# Altium integrated library Integrated_Circuts.IntLib: 76 symbols (part 2 of 4)

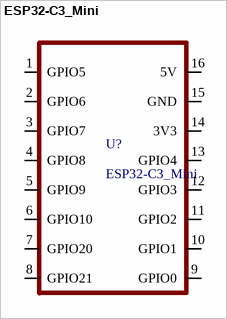
[diagram p23: symbol ESP32-C3_Mini]

## ESP32-C3_Mini
designator U?
footprint ESP32-C3
footprint ESP32-C3_PLS
pins: 1 GPIO5, 2 GPIO6, 3 GPIO7, 4 GPIO8, 5 GPIO9, 6 GPIO10, 7 GPIO20, 8 GPIO21, 9 GPIO0, 10 GPIO1, 11 GPIO2, 12 GPIO3, 13 GPIO4, 14 3V3, 15 GND, 16 5V


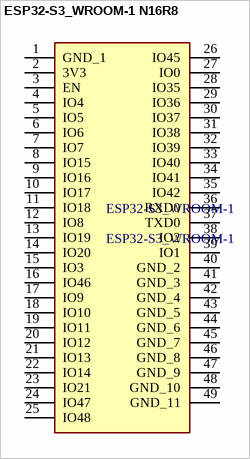
[diagram p24: symbol ESP32-S3_WROOM-1 N16R8]

## ESP32-S3_WROOM-1 N16R8
designator ESP32-S3_WROOM-1, comment ESP32-S3_WROOM-1
ESP32-S3_WROOM-1 N16R8
footprint ESP32S3WROOM1N16R8
pins: 1 GND_1, 2 3V3, 3 EN, 4 IO4, 5 IO5, 6 IO6, 7 IO7, 8 IO15, 9 IO16, 10 IO17, 11 IO18, 12 IO8, 13 IO19, 14 IO20, 15 IO3, 16 IO46, 17 IO9, 18 IO10, 19 IO11, 20 IO12, 21 IO13, 22 IO14, 23 IO21, 24 IO47, 25 IO48, 26 IO45, 27 IO0, 28 IO35, 29 IO36, 30 IO37, 31 IO38, 32 IO39, 33 IO40, 34 IO41, 35 IO42, 36 RXD0, 37 TXD0, 38 IO2, 39 IO1, 40 GND_2, 41 GND_3, 42 GND_4, 43 GND_5, 44 GND_6, 45 GND_7, 46 GND_8, 47 GND_9, 48 GND_10, 49 GND_11


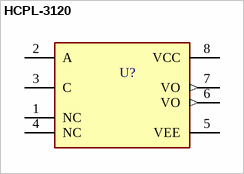
[diagram p25: symbol HCPL-3120]

## HCPL-3120
designator U?  (value not drawn)
footprint HCPL-3120
pins: 1 NC, 2 A, 3 C, 4 NC, 5 VEE (power), 6 VO (out), 7 VO (out), 8 VCC (power)


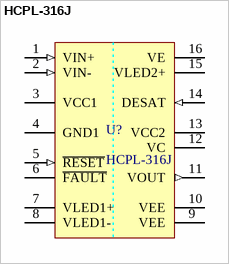
[diagram p26: symbol HCPL-316J]

## HCPL-316J
designator U?
footprint SOIC127P1036X391-16N
pins: 1 VIN+ (in) "Noninverting gate drive voltage output (VOUT) control input.", 2 VIN- (in) "Inverting gate drive voltage output(VOUT) control input.", 3 VCC1 (power) "Positive input supply voltage. (4.5 V to 5.5 V)", 4 GND1 (power) "Input Ground", 5 ~{RESET} (in) "F\A\U\L\T\ reset input.", 6 ~{FAULT} (hiz) "Fault output", 7 VLED1+ "LED 1 anode.", 8 VLED1- "LED 1 cathode.", 9 VEE (power) "Output supply voltage.", 10 VEE (power) "Output supply voltage.", 11 VOUT (out) "Gate drive voltage output.", 12 VC (power) "Collector of output pull-up triple-darlington 0.1 us, asynchronously resets FAULT output high transistor", 13 VCC2 (power) "Positive output supply voltage", 14 DESAT (in) "Desaturation voltage input.", 15 VLED2+ "LED 2 anode.", 16 VE (power) "Common (IGBT emitter) output supply voltage."


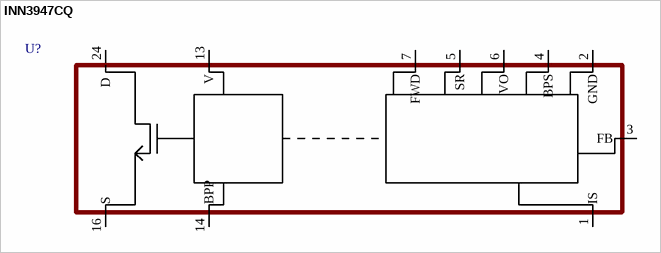
[diagram p27: symbol INN3947CQ]

## INN3947CQ
designator U?
footprint INN3947CQ
pins: 1 IS, 2 GND, 3 FB, 4 BPS, 5 SR, 6 VO, 7 FWD, 13 V, 14 BPP, 16 S, 24 D 


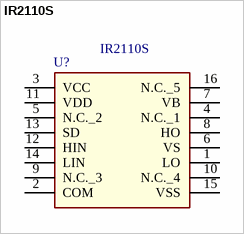
[diagram p28: symbol IR2110S]

## IR2110S
designator U?
IC DRIVER HIGH/LOW SIDE 16-SOIC; Manufacturer_Name: Infineon; Geometry.Height: 2.65mm; Manufacturer_Part_Number: IR2110S; Mouser Part Number: *; Mouser Price/Stock: *; Arrow Part Number: *; Arrow Price/Stock: *; Datasheet Link: https://www.infineon.com/dgdl/ir2110.pdf?fileId=5546d462533600a4015355c80333167e
footprint SOIC127P1036X391-16N
pins: 1 LO, 2 COM, 3 VCC, 4 N.C._1, 5 N.C._2, 6 VS, 7 VB, 8 HO, 9 N.C._3, 10 N.C._4, 11 VDD, 12 HIN, 13 SD, 14 LIN, 15 VSS, 16 N.C._5


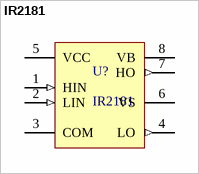
[diagram p29: symbol IR2181]

## IR2181
designator U?
IR2181 Driver
footprint SO8-150
footprint SOIC-8
pins: 1 HIN (in), 2 LIN (in), 3 COM, 4 LO (out), 5 VCC (power), 6 VS (power), 7 HO (out), 8 VB (power)


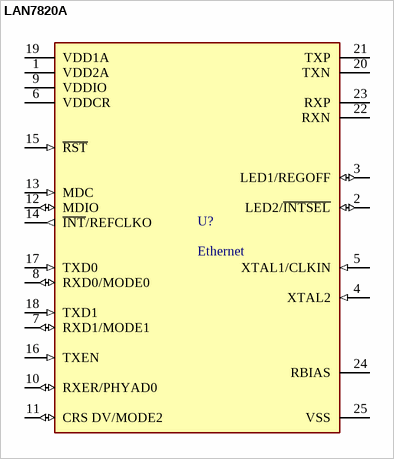
[diagram p30: symbol LAN7820A]

## LAN7820A
designator U?, comment Ethernet
footprint 24QFN-4x4B-IPC_A
footprint 24QFN-4x4B-IPC_B
pins: 1 VDD2A (power), 2 LED2/~{INTSEL} (io), 3 LED1/REGOFF (io), 4 XTAL2 (in), 5 XTAL1/CLKIN (in), 6 VDDCR (power), 7 RXD1/MODE1 (io), 8 RXD0/MODE0 (io), 9 VDDIO (power), 10 RXER/PHYAD0 (io), 11 CRS DV/MODE2 (io), 12 MDIO (io), 13 MDC (in), 14 ~{INT}/REFCLKO (out), 15 ~{RST} (in), 16 TXEN (in), 17 TXD0 (in), 18 TXD1 (in), 19 VDD1A (power), 20 TXN, 21 TXP, 22 RXN, 23 RXP, 24 RBIAS, 25 VSS (power)


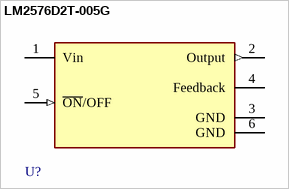
[diagram p31: symbol LM2576D2T-005G]

## LM2576D2T-005G
designator U?  (value not drawn)
footprint ON_Semiconductor_936A-02_MFG
pins: 1 Vin (power), 2 Output (out), 3 GND (power), 4 Feedback, 5 ~{ON}/OFF (in), 6 GND (power)


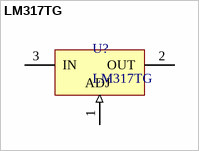
[diagram p32: symbol LM317TG]

## LM317TG
designator U?
footprint TO-220_Bended_Rad
pins: 1 ADJ (in), 2 OUT (power), 3 IN (power)


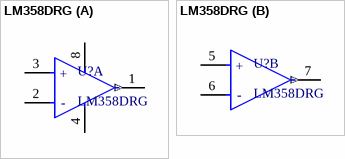
[diagram p33: symbol LM358DRG]

## LM358DRG
designator U?
footprint FP-751-07-IPC_A
footprint FP-751-07-IPC_B
footprint FP-751-07-IPC_C
footprint FP-751-07-MFG
footprint SO8-150
part A pins: 1 OUTPUT A (out), 2 INPUT A- (hiz), 3 INPUT A+ (hiz), 4 VEE/GND (power), 8 VCC (power)
part B pins: 5 INPUT A+ (hiz), 6 INPUT A- (hiz), 7 OUTPUT A (out)
part A text: +; -
part B text: +; -


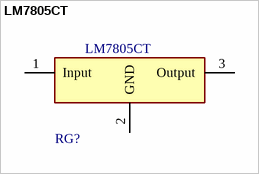
[diagram p34: symbol LM7805CT]

## LM7805CT
designator RG?  Part Number: LM7805CT
REG IC REG LINEAR 5V 1A TO220AB; Manufacturer: Fairchild; Voltage Dropout (Max): 2V @ 1A (Typ); Voltage - Input (Max): 35V; helpURL: https://upverter.com/upn/revision/b27a7358b7dd93a3/; ComponentLink2Description: Datasheet; Temperature: -40°C to +125°C; Package: TO220; Supplier 2: Mouser; Price: 0.384521982769; Supplier 1: Digi-Key; ComponentLink1URL: https://upverter.com/upn/revision/b27a7358b7dd93a3/; Supplier Part Number 2: 512-LM7805CT; Supplier Part Number 1: LM7805CT-ND; ComponentLink1Description: Upverter; ComponentLink2URL: https://www.fairchildsemi.com/datasheets/LM/LM7805.pdf; RoHS: TRUE; Mouser Part Number: 512-LM7805CT; Ipc Land Pattern Name: TO-220; Temperature Range High: +125°C; Digikey Description: REG IC REG LINEAR 5V 1A TO220AB; Digikey Part Number: LM7805CT-ND; Lead Free: yes; Temperature Range Low: -40°C; Voltage - Output: 5V; Current-Output: 1A
footprint Fairchild_LM7805CT_0
footprint TO-220_Bended_Rad
footprint TO-220(bend2)
footprint SOT-223-3
footprint TO-252
pins: 1 Input (power), 2 GND (power), 3 Output


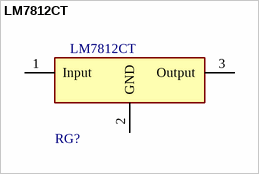
[diagram p35: symbol LM7812CT]

## LM7812CT
designator RG?  Part Number: LM7812CT
REG IC REG LINEAR 12V 1A TO220AB; Manufacturer: Fairchild; Voltage Dropout (Max): 2V @ 1A (Typ); Voltage - Input (Max): 35V; Voltage - Output: 5V; helpURL: https://upverter.com/upn/revision/b27a7358b7dd93a3/; ComponentLink2Description: Datasheet; Temperature: -40°C to +125°C; Package: TO220; Supplier 2: Mouser; Price: 0.384521982769; Supplier 1: Digi-Key; ComponentLink1URL: https://upverter.com/upn/revision/b27a7358b7dd93a3/; Supplier Part Number 2: 512-LM7805CT; Supplier Part Number 1: LM7805CT-ND; ComponentLink1Description: Upverter; ComponentLink2URL: https://www.fairchildsemi.com/datasheets/LM/LM7805.pdf; RoHS: TRUE; Mouser Part Number: 512-LM7805CT; Ipc Land Pattern Name: TO-220; Temperature Range High: +125°C; Digikey Description: REG IC REG LINEAR 5V 1A TO220AB; Digikey Part Number: LM7805CT-ND; Lead Free: yes; Temperature Range Low: -40°C; Current-Output: 1A
footprint Fairchild_LM7805CT_0
footprint TO-220_Bended_Rad
footprint TO-220_lay
footprint TO-220(bend2)
pins: 1 Input (power), 2 GND (power), 3 Output


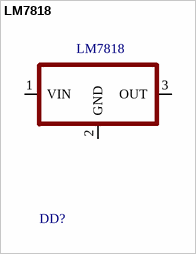
[diagram p36: symbol LM7818]

## LM7818
designator DD?
footprint TO-252
pins: 1 VIN, 2 GND, 3 OUT


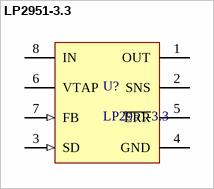
[diagram p37: symbol LP2951-3.3]

## LP2951-3.3
designator U?
footprint SOIC-8_L
footprint SOIC-8_M
footprint SOIC-8_N
footprint SOIC-8
pins: 1 OUT (power), 2 SNS, 3 SD (in), 4 GND (power), 5 ~{ERR} (oc), 6 VTAP, 7 FB (in), 8 IN (power)


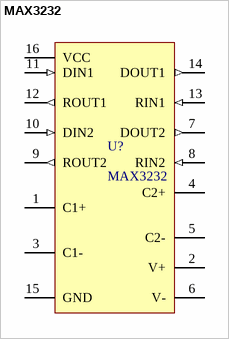
[diagram p38: symbol MAX3232]

## MAX3232
designator U?
footprint SOIC-16-M
footprint FP-SO16-IPC_A
footprint SOIC-16-L
footprint SOIC-16-N
pins: 1 C1+, 2 V+ (power), 3 C1-, 4 C2+, 5 C2-, 6 V- (power), 7 DOUT2 (out), 8 RIN2 (in), 9 ROUT2 (out), 10 DIN2 (in), 11 DIN1 (in), 12 ROUT1 (out), 13 RIN1 (in), 14 DOUT1 (out), 15 GND (power), 16 VCC (power)


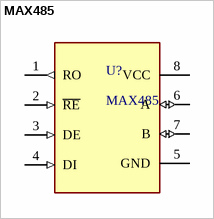
[diagram p39: symbol MAX485]

## MAX485
designator U?
footprint SOIC-8-MFG
footprint SOIC-8-A
footprint SOIC-8-B
footprint SOIC-8-C
pins: 1 RO (out), 2 ~{RE} (in), 3 DE (in), 4 DI (in), 5 GND (power), 6 A (io), 7 B (io), 8 VCC (power)


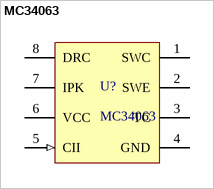
[diagram p40: symbol MC34063]

## MC34063
designator U?
footprint SO8-150
footprint SOIC-8_M
footprint SOIC-8-B
pins: 1 SWC (oc), 2 SWE (oe), 3 TC, 4 GND (power), 5 CII (in), 6 VCC (power), 7 IPK, 8 DRC (oc)


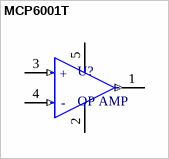
[diagram p41: symbol MCP6001T]

## MCP6001T
designator U?, comment OP AMP
footprint SOT-23-5
pins: 1 VOUT (out), 2 VSS (power), 3 VIN+ (in), 4 VIN- (in), 5 VDD (power)
text: +; -


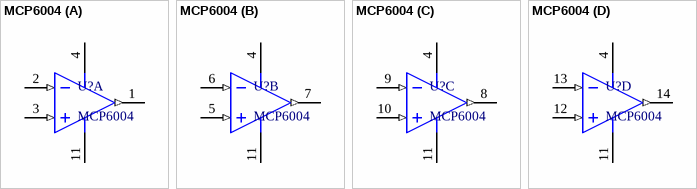
[diagram p42: symbol MCP6004]

## MCP6004
designator U?
MCP6004 TSSOP
footprint TSSOP-ST14_L (TSOP, 14-Leads, Body 5x4.4mm, Pitch 0.65mm, IPC High Density)
footprint TSSOP-ST14_M (TSOP, 14-Leads, Body 5x4.4mm, Pitch 0.65mm, IPC Low Density)
footprint TSSOP-ST14_N
part A pins: 1 VOUTA (out), 2 VINA- (in), 3 VINA+ (in), 4 VDD (power), 11 VSS (power)
part B pins: 4 VDD (power), 5 VINB+ (in), 6 VINB- (in), 7 VOUTB (out), 11 VSS (power)
part C pins: 4 VDD (power), 8 VOUTC (out), 9 VINC- (in), 10 VINC+ (in), 11 VSS (power)
part D pins: 4 VDD (power), 11 VSS (power), 12 VIND+ (in), 13 VIND- (in), 14 VOUTD (out)


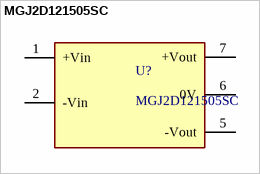
[diagram p43: symbol MGJ2D121505SC]

## MGJ2D121505SC
designator U?
footprint FP-MGJ2D121505SC-MFG
pins: 1 +Vin (power), 2 -Vin (power), 5 -Vout, 6 0V (power), 7 +Vout


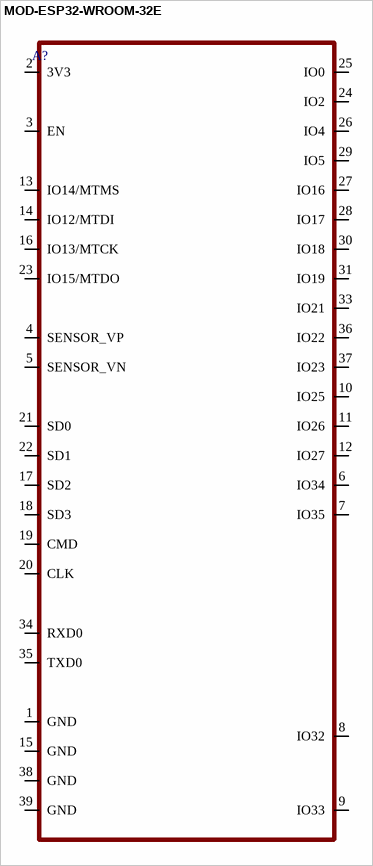
[diagram p44: symbol MOD-ESP32-WROOM-32E]

## MOD-ESP32-WROOM-32E
designator A?
footprint MOD-ESP32-WROOM-32E
pins: 1 GND, 2 3V3, 3 EN, 4 SENSOR_VP, 5 SENSOR_VN, 6 IO34, 7 IO35, 8 IO32, 9 IO33, 10 IO25, 11 IO26, 12 IO27, 13 IO14/MTMS, 14 IO12/MTDI, 15 GND, 16 IO13/MTCK, 17 SD2, 18 SD3, 19 CMD, 20 CLK, 21 SD0, 22 SD1, 23 IO15/MTDO, 24 IO2, 25 IO0, 26 IO4, 27 IO16, 28 IO17, 29 IO5, 30 IO18, 31 IO19, 33 IO21, 34 RXD0, 35 TXD0, 36 IO22, 37 IO23, 38 GND, 39 GND


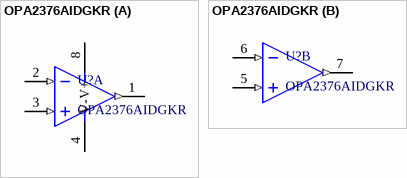
[diagram p45: symbol OPA2376AIDGKR]

## OPA2376AIDGKR
designator U?
Precision, Low Noise, Low Quiescent Current Operational Amplifier, 2 to 5.5 V, -40 to 125 degC, 8-pin SOP (DGK8), Green (RoHS & no Sb/Br)
footprint DGK0008A_L (TSOP, 8-Leads, Body 3.1x3.1mm, Pitch 0.65mm, IPC High Density)
footprint DGK0008A_M (TSOP, 8-Leads, Body 3.1x3.1mm, Pitch 0.65mm, IPC Low Density)
footprint DGK0008A_N (TSOP, 8-Leads, Body 3.1x3.1mm, Pitch 0.65mm, IPC Medium Density)
part A pins: 1 OUT A (out), 2 IN A- (in), 3 IN A+ (in), 4 V- (power), 8 V+ (power)
part B pins: 5 IN B+ (in), 6 IN B- (in), 7 OUT B (out)
